# Altium footprint library PcbLibUltimate (1).pcblib: 202 footprints (part 8 of 13)
Each footprint in its own frame and in the unit in brackets; x right, y up, seen from the top. Pads: shape width x height; smd on the part's side, far side on the other; paste and mask are expansions set on the pad; w line width, h text height; cw(c..) or ccw(c..) is an arc to the next point about the centre after c.
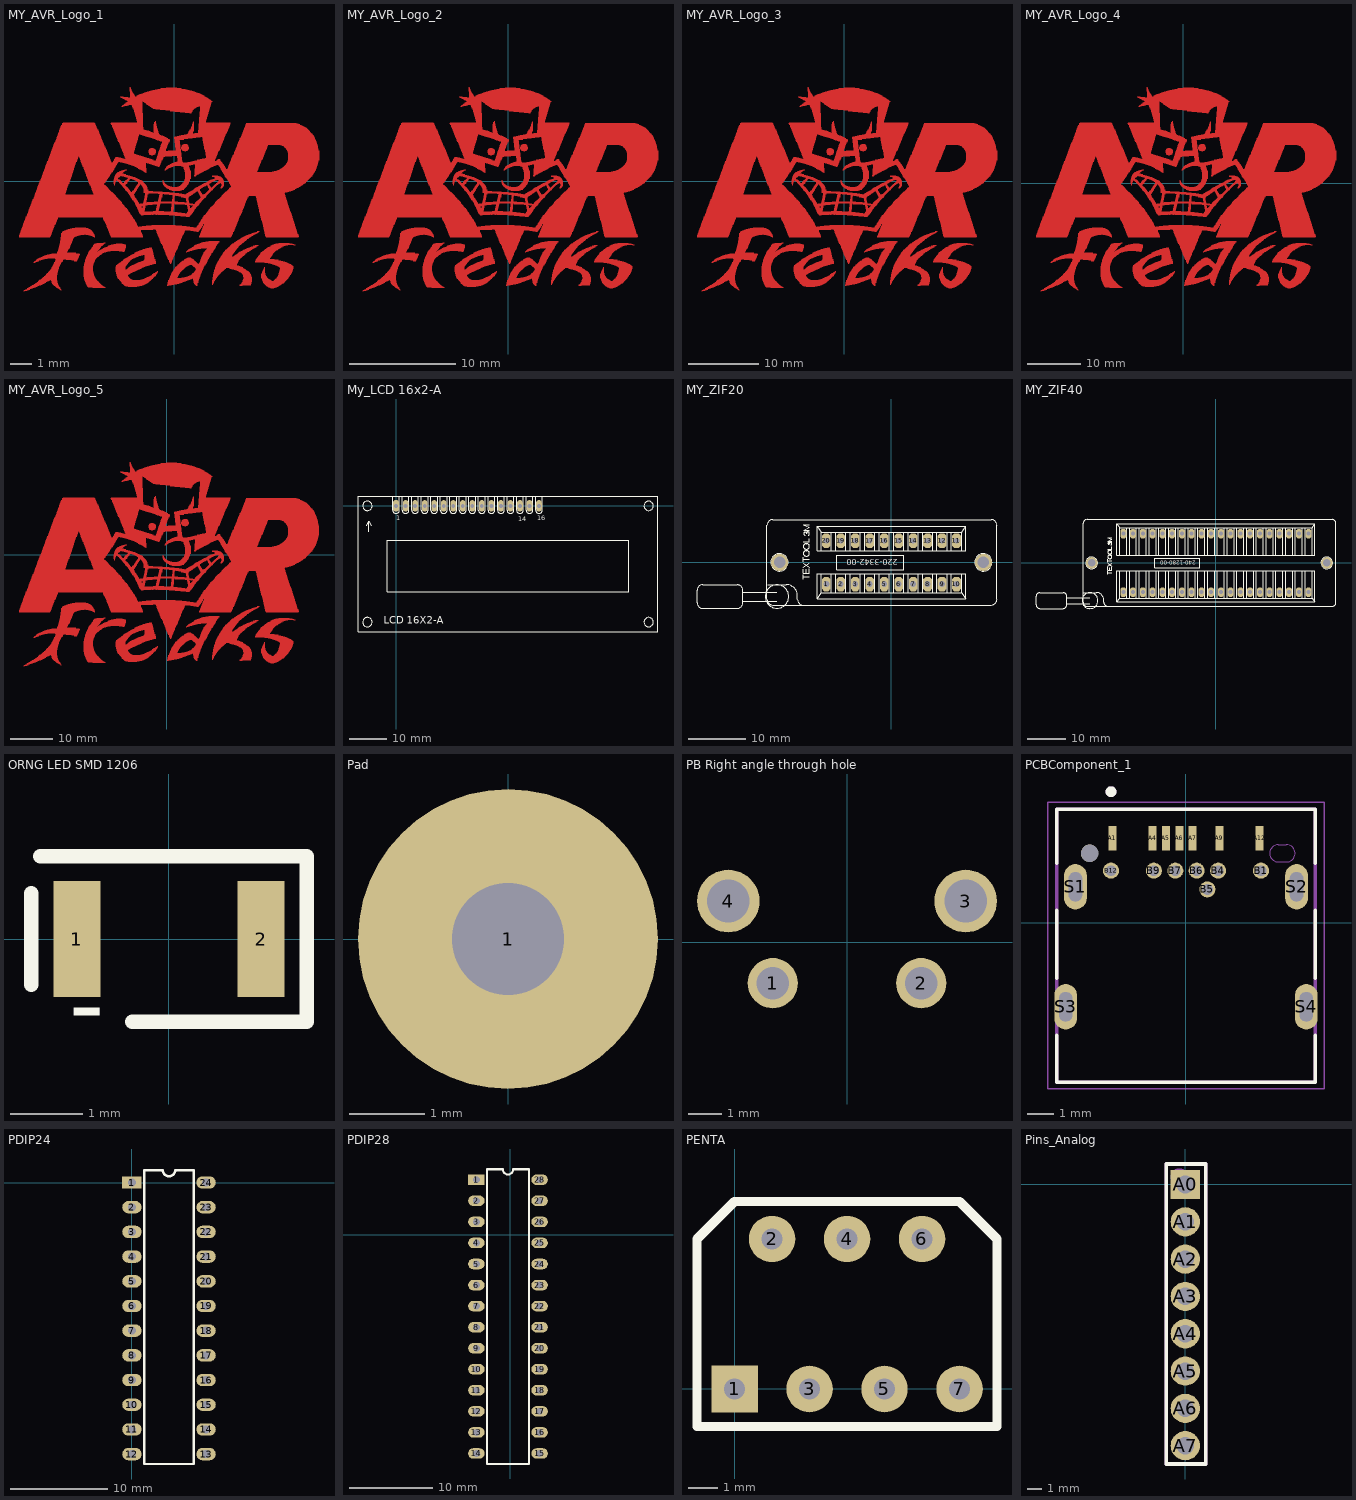
[diagram p7: the footprints below, top view; thin cyan lines are the x and y axes]

## MY_AVR_Logo_1 [mil]
Top Layer:
  drawing of 2521 lines, arcs and shapes, not listed

## MY_AVR_Logo_2 [mil]
Top Layer:
  drawing of 2521 lines, arcs and shapes, not listed

## MY_AVR_Logo_3 [mil]
Top Layer:
  drawing of 2521 lines, arcs and shapes, not listed

## MY_AVR_Logo_4 [mil]
Top Layer:
  drawing of 2521 lines, arcs and shapes, not listed

## MY_AVR_Logo_5 [mil]
Top Layer:
  drawing of 2521 lines, arcs and shapes, not listed

## My_LCD 16x2-A [mil]
pads (20):
  round 0 all layers, no hole: 0(-300,0) 17(2650,0) 18(-300,-1220) 19(2650,-1220)
  oct 60x120 hole 40: 1(0,0)
  oval 60x120 hole 40: 2(100,0) 3(200,0) 4(300,0) 5(400,0) 6(500,0) 7(600,0) 8(700,0) 9(800,0) 10(900,0) 11(1000,0) 12(1100,0) 13(1200,0) 14(1300,0) 15(1400,0) 16(1500,0)
Top Overlay:
  circle w5: c-301.58,-1220.5 r49.21
  circle w5: c2651.18,-1220.5 r49.21
  circle w5: c-301.58,0 r49.21
  circle w5: c2651.18,0 r49.21
  lines w5: -310,-210 -285,-160 -260,-210 ; -285,-270.7 -285,-165 ; -35,95 -35,-45 ccw(c0,-45) 35,-45 35,95 ; 65,95 65,-45 ccw(c100,-45) 135,-45 135,95 ; 165,95 165,-45 ccw(c200,-45) 235,-45 235,95 ; 265,95 265,-45 ccw(c300,-45) 335,-45 335,95 ; 365,95 365,-45 ccw(c400,-45) 435,-45 435,95 ; 465,95 465,-45 ccw(c500,-45) 535,-45 535,95 ; 565,95 565,-45 ccw(c600,-45) 635,-45 635,95 ; 665,95 665,-45 ccw(c700,-45) 735,-45 735,95 ; 765,95 765,-45 ccw(c800,-45) 835,-45 835,95 ; 865,95 865,-45 ccw(c900,-45) 935,-45 935,95 ; 965,95 965,-45 ccw(c1000,-45) 1035,-45 1035,95 ; 1065,95 1065,-45 ccw(c1100,-45) 1135,-45 1135,95 ; 1165,95 1165,-45 ccw(c1200,-45) 1235,-45 1235,95 ; 1265,95 1265,-45 ccw(c1300,-45) 1335,-45 1335,95 ; 1365,95 1365,-45 ccw(c1400,-45) 1435,-45 1435,95 ; 1465,95 1465,-45 ccw(c1500,-45) 1535,-45 1535,95 ; -400,-1318.93 2749.6,-1318.93 2749.6,98.4 -400,98.4 -400,-1318.93 ; -94.88,-901.6 -94.88,-358.3 2444.49,-358.3 2444.49,-901.6 -94.88,-901.6
  text "14" at 1280,-160 h50
  text "1" at 0,-150 h50
  text "16" at 1480,-150 h50
  text "LCD 16X2-A" at -130,-1240 h75

## MY_ZIF20 [mil]
height 472.44
pads (22):
  oct 60x100 hole 40: 1(-450,-150) 2(-350,-150) 3(-250,-150) 4(-150,-150) 5(-50,-150) 6(50,-150) 7(150,-150) 8(250,-150) 9(350,-150) 10(450,-150) 11(450,150) 12(350,150) 13(250,150) 14(150,150) 15(50,150) 16(-50,150) 17(-150,150) 18(-250,150) 19(-350,150) 20(-450,150)
  round 118.11 hole 78.74 unplated: ""(-774.02,0) ""(636.22,0)
Top Overlay:
  drawing of 157 lines, arcs and shapes, not listed
  text "220-3342-00" at 45,20 h40

## MY_ZIF40 [mil]
height 472.44
pads (42):
  oct 60x100 hole 40: 1(-950,-300) 2(-850,-300) 3(-750,-300) 4(-650,-300) 5(-550,-300) 6(-450,-300) 7(-350,-300) 8(-250,-300) 9(-150,-300) 10(-50,-300) 11(50,-300) 12(150,-300) 13(250,-300) 14(350,-300) 15(450,-300) 16(550,-300) 17(650,-300) 18(750,-300) 19(850,-300) 20(950,-300) 21(950,300) 22(850,300) 23(750,300) 24(650,300) 25(550,300) 26(450,300) 27(350,300) 28(250,300) 29(150,300) 30(50,300) 31(-50,300) 32(-150,300) 33(-250,300) 34(-350,300) 35(-450,300) 36(-550,300) 37(-650,300) 38(-750,300) 39(-850,300) 40(-950,300)
  round 118.11 hole 78.74 unplated: ""(-1274.02,0) ""(1136.22,0)
Top Overlay:
  drawing of 197 lines, arcs and shapes, not listed
  text "240-1280-00" at -205,20 h40

## ORNG LED SMD 1206 [mm]
pads (2):
  rect 0.65x1.6 smd: 1(-1.275,0) 2(1.275,0)
Top Overlay:
  lines w0.2: -1.905,-0.635 -1.905,0.635 ; -1.778,1.143 1.905,1.143 1.905,-1.143 -0.508,-1.143
  text "-" at -0.889,-0.635 h1
3D body "User Library-LED 1206 RED.step": height 1.1, standoff 0, extent -1.6,-0.8 1.6,0.8

## Pad [mm]
pads (1):
  round 4 hole 1.5: 1(0,0)

## PB Right angle through hole [mm]
pads (4):
  round 1.524 hole 0.99: 1(-2.25,-1.245) 2(2.25,-1.245)
  round 1.9 hole 1.3: 3(3.6,1.245) 4(-3.6,1.245)
3D body "Tactile Switch SPST-NO Side Actuated Through Hole, Right Angle 1-1825027-1.stp": height 7.06, standoff -3.51, extent -4.205,-9.596 4.205,2.757

## PCBComponent_1 [mm]
pads (19):
  rect 0.3x0.9 smd: A1(-2.75,3.145) A4(-1.25,3.145) A5(-0.75,3.145) A6(-0.25,3.145) A7(0.25,3.145) A9(1.25,3.145) A12(2.75,3.145)
  round 0.6 hole 0.4: B1(2.8,1.935) B4(1.2,1.935) B5(0.8,1.235) B6(0.4,1.935) B7(-0.4,1.935) B9(-1.2,1.935) B12(-2.8,1.935)
  oval 0.85x1.7 hole 0.5 slot 1.1 at 90 deg: S1(-4.13,1.335) S2(4.13,1.335) S3(-4.49,-3.145) S4(4.49,-3.145)
  round 0.65 hole 0.65 unplated: ""(-3.6,2.585)
Top Overlay:
  circle w0.2: c-2.8,4.885 r0.1
  lines w0.127: -4.825,-4.215 -4.825,-5.965 4.825,-5.965 4.825,-4.215 ; -4.825,-2.075 -4.825,0.455 ; -4.825,2.215 -4.825,4.235 4.825,4.235 4.825,2.215 ; 4.825,-2.075 4.825,0.455
Mechanical 1:
  lines w0: 3.45,2.26 cw(c3.45,2.585) 3.45,2.91 3.75,2.91 cw(c3.75,2.585) 3.75,2.26 3.45,2.26
Mechanical 13:
  circle w0.2: c-2.8,4.885 r0.1
  lines w0.127: -4.825,-5.965 4.825,-5.965 4.825,4.235 -4.825,4.235 -4.825,-5.965
Mechanical 15:
  lines w0.05: -5.165,-6.215 5.17,-6.215 5.17,4.485 -5.165,4.485 -5.165,-6.215
3D body "10137061c.stp": height 3.17, standoff -1.02, extent -4.825,-5.946 4.825,4.254

## PDIP24 [mil]
pads (24):
  rect 78.74x50 hole 32: 1(0,0)
  oval 78.74x50 hole 32: 2(0,-100) 3(0,-200) 4(0,-300) 5(0,-400) 6(0,-500) 7(0,-600) 8(0,-700) 9(0,-800) 10(0,-900) 11(0,-1000) 12(0,-1100) 13(300,-1100) 14(300,-1000) 15(300,-900) 16(300,-800) 17(300,-700) 18(300,-600) 19(300,-500) 20(300,-400) 21(300,-300) 22(300,-200) 23(300,-100) 24(300,0)
Top Overlay:
  lines w10: 50,-1140 50,-650 50,50 125,50 ccw(c150,50) 175,50 250,50 250,-650 250,-1140 50,-1140

## PDIP28 [mil]
pads (28):
  rect 78.74x50 hole 32: 1(-160,260)
  oval 78.74x50 hole 32: 2(-160,160) 3(-160,60) 4(-160,-40) 5(-160,-140) 6(-160,-240) 7(-160,-340) 8(-160,-440) 9(-160,-540) 10(-160,-640) 11(-160,-740) 12(-160,-840) 13(-160,-940) 14(-160,-1040) 15(140,-1040) 16(140,-940) 17(140,-840) 18(140,-740) 19(140,-640) 20(140,-540) 21(140,-440) 22(140,-340) 23(140,-240) 24(140,-140) 25(140,-40) 26(140,60) 27(140,160) 28(140,260)
Top Overlay:
  lines w10: -110,-1090 -110,-390 -110,310 -35,310 ccw(c-10,310) 15,310 90,310 90,-390 90,-1090 -110,-1090

## PENTA [mil]
pads (7):
  rect 62x62 hole 28: 1(0,0)
  round 62 hole 28: 2(50,200) 3(100,0) 4(150,200) 5(200,0) 6(250,200) 7(300,0)
Top Overlay:
  lines w12: -50,-50 350,-50 350,200 300,250 0,250 -50,200 -50,-50

## Pins_Analog [mm]
pads (8):
  rect 2x2 hole 1.2: A0(0,0)
  round 2 hole 1.2: A1(0,-2.55) A2(0,-5.1) A3(0,-7.65) A4(0,-10.2) A5(0,-12.75) A6(0,-15.3) A7(0,-17.85)
Top Overlay:
  lines w0.254: -1.3,-19.1 1.4,-19.1 1.4,1.4 -1.3,1.4 -1.3,0 -1.3,-19.1
Mechanical 2:
  circle w0.8: c-0.4,0.5 r0.2
  lines w0.254: -1.3,-19.1 -1.3,1.4 1.4,1.4 1.4,-19.1 -1.3,-19.1
  text ".Designator" at -0.5,-4.8 h1.52
3D body "61300811121 (rev1).stp": height 8.05, standoff -3.49, extent -1.24,-19.02 1.3,1.3